# Altium footprint library PcbLib1.PcbLib: 170 footprints (part 2 of 11)
Each footprint in its own frame and in the unit in brackets; x right, y up, seen from the top. Pads: shape width x height; smd on the part's side, far side on the other; paste and mask are expansions set on the pad; w line width, h text height; cw(c..) or ccw(c..) is an arc to the next point about the centre after c.
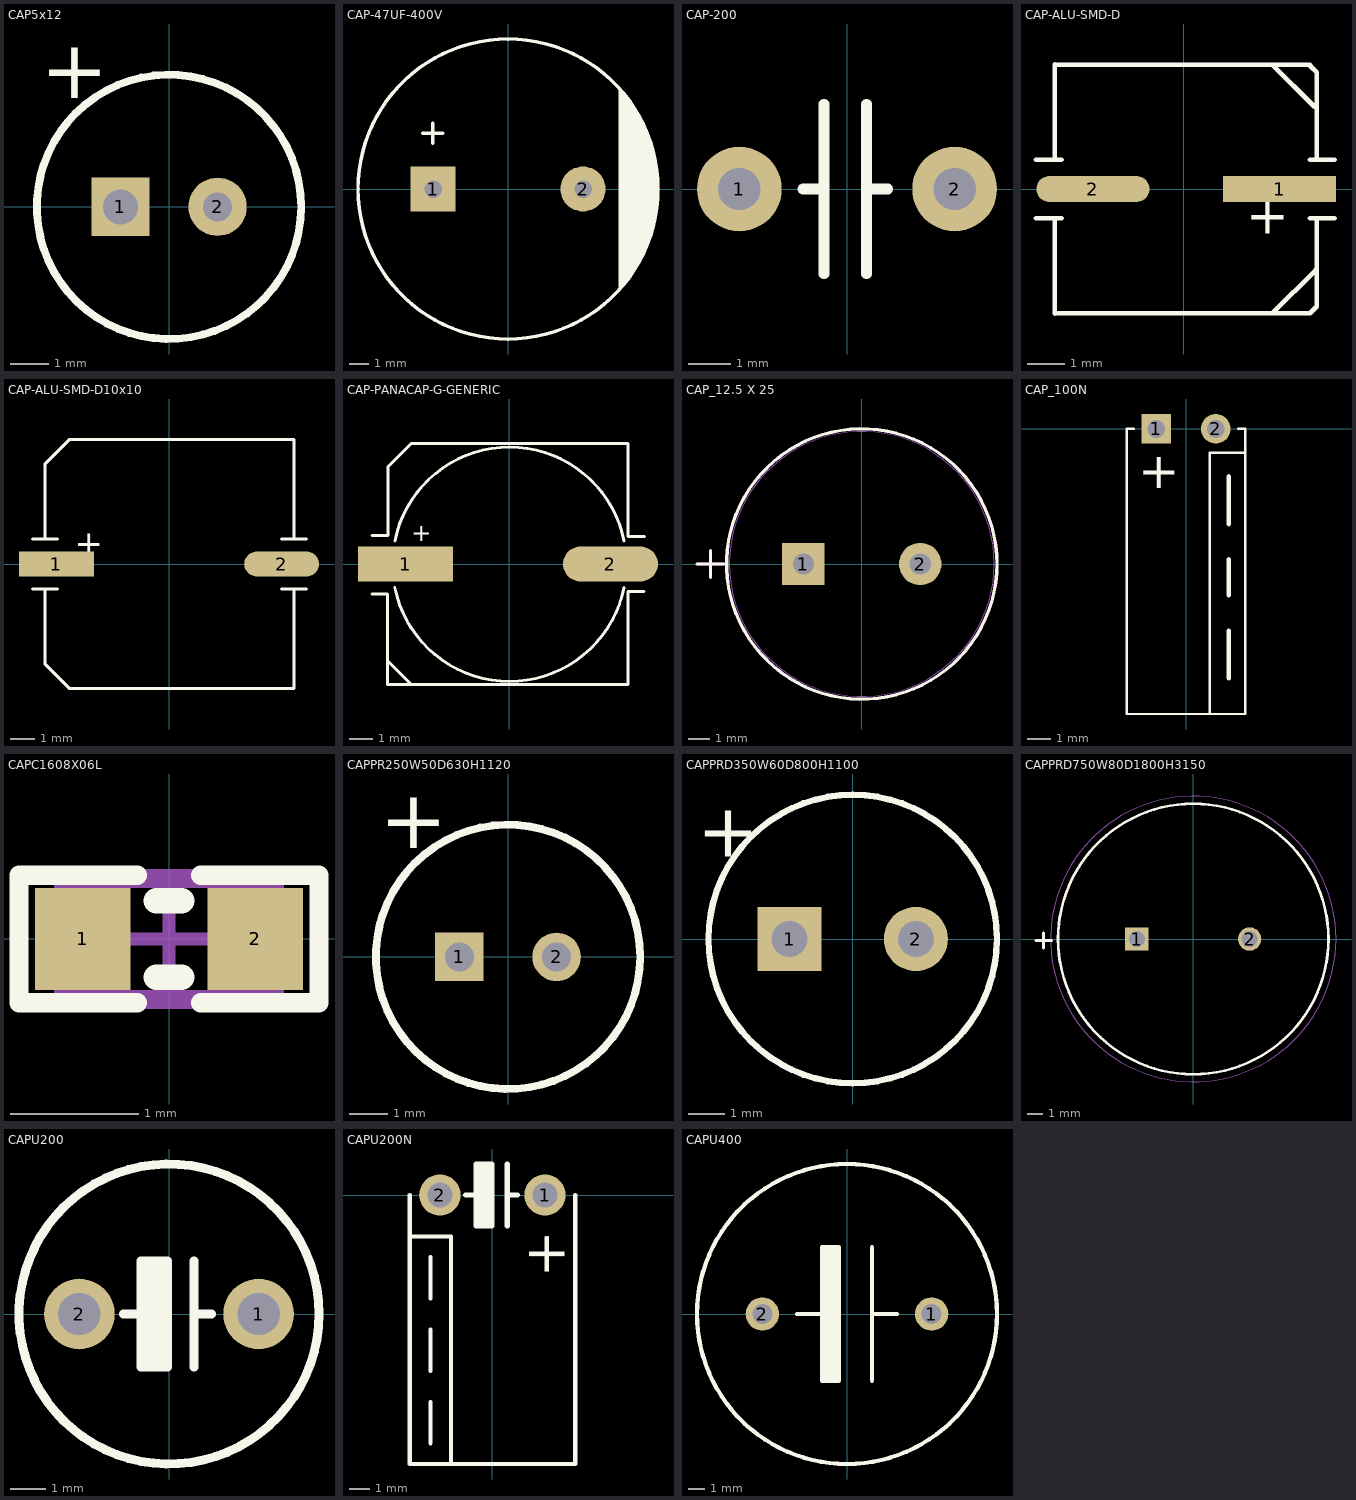
[diagram p1: the footprints below, top view; thin cyan lines are the x and y axes]

## CAP5x12 [mm] "Electrolytic Capacitor Radial 5x12 ver.2"
height 11.2
pads (2):
  rect 1.5x1.5 hole 0.9: 1(-1.25,0)
  round 1.5 hole 0.75: 2(1.25,0)
Top Overlay:
  circle w0.2: c0,0 r3.4
  text "+" at -3.302,2.794 h1.52
Mechanical 5:
  circle w0.1: c0,0 r3.4
3D body: height 13.2, standoff -1.9, extent -2.617,-2.565 2.463,2.515

## CAP10x10 [mm]

## CAP-47UF-400V [mil] "Tu hoa 4700uF/25V"
height 600
pads (2):
  rect 90x90 hole 35: 1(-150,0)
  round 90 hole 35: 2(150,0)
Top Overlay:
  circle w7: c0,0 r300
  region: 275,112 283,96 292,79 297,39 300,-9 299,-34 292,-69 279,-115 247,-171 232,-191 221,-203 221,200 234.5,182.5 245,168 258,153
  lines w7: -171,112 -131,112 ; -151,92 -151,132
3D body: height 1028.04, standoff -109.76, extent -324.22,-324.37 324.8,324.39

## CAP-200 [mm]
pads (2):
  round 2 hole 1: 1(-2.54,0) 2(2.54,0)
Top Overlay:
  lines w0.254: -1.04,0 -0.54,0 ; -0.54,-2 -0.54,2 ; 0.46,-2 0.46,2 ; 0.46,0 0.96,0

## CAP-ALU-SMD-D [mm]
height 4
pads (2):
  rect 3x0.7 smd: 1(2.54,0)
  oval 3x0.7 smd: 2(-2.413,0)
Top Overlay:
  lines w0.127: -3.925,-0.775 -3.25,-0.775 ; -3.925,0.775 -3.25,0.775 ; -3.429,-0.775 -3.429,-3.302 3.35,-3.3 3.531,-3.119 3.531,-0.775 ; -3.429,0.775 -3.429,3.302 -3.427,3.3 3.35,3.3 ; 2.35,-3.3 3.511,-2.139 ; 2.35,3.3 3.46,2.19 ; 3.35,-0.775 4,-0.775 ; 3.35,0.775 4,0.775 ; 3.35,3.277 3.531,3.097 3.531,0.775 ; 3.35,3.3 3.35,3.3
  text "+" at 2.8,-0.325 h1
3D body: height 5.4, standoff 0, extent -3.5,-3.3 3.5,3.3

## CAP-ALU-SMD-D10x10 [mm]
height 4
pads (2):
  rect 3x1 smd: 1(-4.54,0)
  oval 3x1 smd: 2(4.5,0)
Top Overlay:
  lines w0.127: -5.5,-1 -4.5,-1 ; -5.5,1 -4.5,1 ; -5,-1 -5,-4 -4,-5 5,-5 5,-1 ; -5,1 -5,4 -4,5 5,5 5,1 ; 4.5,-1 5.5,-1 ; 4.5,1 5.5,1
  text "+" at -3.8,0.325 h1
3D body: height 5.4, standoff 0, extent -3.5,-3.3 3.5,3.3

## CAP-PANACAP-G-GENERIC [mil]
height 600
pads (2):
  rect 160x59.06 smd: 1(-175,0)
  oval 160x59.06 smd: 2(170,0)
Top Overlay:
  lines w5: -231.3,-50.2 -205.71,-50.2 ; -231.3,48.23 -205.71,48.23 ; -205.71,-163.39 -205.71,-50.2 ; -205.71,-104.33 -205.71,-50.2 ; -204.72,-163.39 -165.35,-202.76 ; -204.72,48.23 -204.72,163.39 -165.35,202.76 199.8,202.76 199.8,46.26 227.36,46.26 ; -193.14,-39.37 ccw(c-0.11,-0.76) 192.91,-39.37 ; -193.03,38.61 cw(c0,0) 193.03,38.61 ; 226.38,-46.26 199.8,-46.26 ; -205.71,-202.76 199.8,-202.76 199.8,-46.26 ; -205.71,-202.76 -205.71,-202.76 ; -205.71,-202.76 -205.71,-50.2 ; -205.71,-129.92 -205.71,-129.92 ; -205.71,-129.92 -205.71,-50.2 ; 199.8,-46.26 199.8,-46.26
  text "+" at -165.35,38.39 h30
3D body: height 401.57, standoff 0, extent -233.35,-202.76 223.34,202.75

## CAP_12.5 X 25 [mm] "0805 with 30mil clearance between pads"
height 3.05
pads (2):
  rect 2x2 hole 1 mask-25.4: 1(-2.756,0)
  round 2 hole 1 mask-25.4: 2(2.756,0)
Top Overlay:
  circle w0.152: c0,0 r6.375
  lines w0.152: -7.772,0 -6.502,0 ; -7.137,-0.635 -7.137,0.635
Top Paste:
  region: 2.756,-0.692 2.935,-0.668 3.102,-0.599 3.245,-0.489 3.355,-0.346 3.424,-0.179 3.448,0 3.424,0.179 3.355,0.346 3.245,0.489 3.102,0.599 2.935,0.668 2.756,0.692 2.577,0.668 2.41,0.599 2.267,0.489 2.157,0.346 2.088,0.179 2.064,0 2.088,-0.179 2.157,-0.346 2.267,-0.489 2.41,-0.599 2.577,-0.668
  region: -3.442,-0.686 -2.07,-0.686 -2.07,0.686 -3.442,0.686
Top Solder:
  region: 2.756,-0.692 2.935,-0.668 3.102,-0.599 3.245,-0.489 3.355,-0.346 3.424,-0.179 3.448,0 3.424,0.179 3.355,0.346 3.245,0.489 3.102,0.599 2.935,0.668 2.756,0.692 2.577,0.668 2.41,0.599 2.267,0.489 2.157,0.346 2.088,0.179 2.064,0 2.088,-0.179 2.157,-0.346 2.267,-0.489 2.41,-0.599 2.577,-0.668
  region: -3.442,-0.686 -2.07,-0.686 -2.07,0.686 -3.442,0.686
Bottom Solder:
  region: 2.756,-0.692 2.935,-0.668 3.102,-0.599 3.245,-0.489 3.355,-0.346 3.424,-0.179 3.448,0 3.424,0.179 3.355,0.346 3.245,0.489 3.102,0.599 2.935,0.668 2.756,0.692 2.577,0.668 2.41,0.599 2.267,0.489 2.157,0.346 2.088,0.179 2.064,0 2.088,-0.179 2.157,-0.346 2.267,-0.489 2.41,-0.599 2.577,-0.668
  region: -3.442,-0.686 -2.07,-0.686 -2.07,0.686 -3.442,0.686
Mechanical 1:
  circle w0.025: c0,0 r6.248
  lines w0.025: -7.772,0 -6.502,0 ; -7.137,-0.635 -7.137,0.635
Mechanical 16:
  lines w0.152: -7.772,0 -6.502,0 ; -7.137,-0.635 -7.137,0.635
3D body: height 24.99, standoff -4.37, extent -6.248,-6.245 6.233,6.245

## CAP_100N [mm] "PANASONIC"
height 11.2
pads (2):
  rect 1.25x1.25 hole 0.75: 1(-1.25,0)
  round 1.25 hole 0.75: 2(1.25,0)
Top Overlay:
  lines w0.1: -2.2,0 -2.5,0 -2.5,-12 2.5,-12 2.5,0 2.2,0 ; 1,-12 1,-1 2.5,-1
  lines w0.2: 1.8,-10.5 1.8,-8.5 ; 1.8,-7 1.8,-5.5 ; 1.8,-4 1.8,-2
  text "+" at -2,-2.5 h1.52

## CAPC1608X06L [mm] "Chip Capacitor, 2-Leads, Body 1.6x0.8mm, IPC High Density"
height 0.55
pads (2):
  rect 0.75x0.8 smd: 1(-0.675,0) 2(0.675,0)
Top Overlay:
  lines w0.152: -0.25,-0.5 -1.175,-0.5 -1.175,0.5 -0.25,0.5 ; 0.25,-0.5 1.175,-0.5 1.175,0.5 0.25,0.5
  lines w0.2: -0.1,-0.3 0.1,-0.3 ; -0.1,0.3 0.1,0.3
Mechanical 13:
  lines w0.1: -0.85,-0.45 -0.85,0.45 0.85,0.45 0.85,-0.45 -0.85,-0.45
Mechanical 15:
  lines w0.1: -0.45,0 0.45,0 ; 0,-0.45 0,0.45 ; -1.175,-0.5 1.175,-0.5 1.175,0.5 -1.175,0.5 -1.175,-0.5
3D body: height 0.8, standoff 0, extent -0.8,-0.43 0.8,0.43

## CAPPR250W50D630H1120 [mm] "PANASONIC"
height 11.2
pads (2):
  rect 1.25x1.25 hole 0.75: 1(-1.25,0)
  round 1.25 hole 0.75: 2(1.25,0)
Top Overlay:
  circle w0.2: c0,0 r3.4
  text "+" at -3.302,2.794 h1.52
Mechanical 5:
  circle w0.1: c0,0 r3.4
3D body: height 12.21, standoff -4.5, extent -3.373,-3.395 3.397,3.394

## CAPPRD350W60D800H1100 [mm] "Capacitor, Alum, 8x11mm"
height 12
pads (2):
  rect 1.78x1.78 hole 1: 1(-1.75,0)
  round 1.78 hole 1: 2(1.75,0)
Top Overlay:
  circle w0.178: c0,0 r4
  text "+" at -4.318,2.286 h1.5
Mechanical 5:
  circle w0.1: c0,0 r4
  text "+" at -5.5,0 h1.5
3D body: height 11.79, standoff -3.71, extent -4.025,-4.027 4.026,4.024

## CAPPRD750W80D1800H3150 [mm] "CAPACITOR, POLARIZED, 0.8MM LEAD DIA, PITCH 7.5MM"
height 33
pads (2):
  rect 1.554x1.554 / inner round 1.554 / far side rect 1.554x1.554 hole 1.054: 1(-3.75,0)
  round 1.554 hole 1.054: 2(3.75,0)
Top Overlay:
  circle w0.178: c0,0 r9
  lines w0.2: -10.465,-0.102 -9.449,-0.102 ; -9.957,-0.61 -9.957,0.406
Mechanical 5:
  circle w0.127: c0,0 r9
  lines w0.2: -10.465,-0.102 -9.449,-0.102 ; -9.957,-0.61 -9.957,0.406
Mechanical 15:
  circle w0.05: c0,0 r9.5
3D body: height 33, standoff 0, extent -8.929,-8.982 9,8.982

## CAPU200 [mm]
pads (2):
  round 2 hole 1.2: 1(2.54,0) 2(-2.54,0)
Top Overlay:
  circle w0.254: c0,0 r4.25
  rectangle: -0.79,-1.5 -0.04,1.5
  lines w0.254: -1.29,0 -0.79,0 ; 0.71,-1.5 0.71,1.5 ; 0.71,0 1.21,0 ; -0.79,-1.5 -0.79,1.5 -0.04,1.5 -0.04,-1.5 -0.79,-1.5

## CAPU200N [mm]
pads (2):
  round 2 hole 1.2: 1(2.54,0) 2(-2.54,0)
Top Overlay:
  rectangle: -0.79,-1.5 -0.04,1.5
  lines w0.2: -4,-2 -2,-2 -2,-13 ; -4,0 -4,-13 4,-13 4,0 ; -3,-12 -3,-10 ; -3,-8.5 -3,-6.5 ; -3,-5 -3,-3
  lines w0.254: -1.29,0 -0.79,0 ; 0.71,-1.5 0.71,1.5 ; 0.71,0 1.21,0 ; -0.79,-1.5 -0.04,-1.5 -0.04,1.5 -0.79,1.5 -0.79,-1.5
  text "+" at 3.5,-4 h2

## CAPU400 [mm]
pads (2):
  round 2 hole 1.2: 1(5.08,0) 2(-5.08,0)
Top Overlay:
  circle w0.254: c0,0 r9
  rectangle: -1.5,-4 -0.5,4
  lines w0.254: -3,0 -1.5,0 ; 1.5,-4 1.5,4 ; 1.5,0 3,0 ; -1.5,-4 -0.5,-4 -0.5,4 -1.5,4 -1.5,-4